# Altium footprint library Pin Header.PcbLib: 138 footprints (part 2 of 9)
Each footprint in its own frame and in the unit in brackets; x right, y up, seen from the top. Pads: shape width x height; smd on the part's side, far side on the other; paste and mask are expansions set on the pad; w line width, h text height; cw(c..) or ccw(c..) is an arc to the next point about the centre after c.
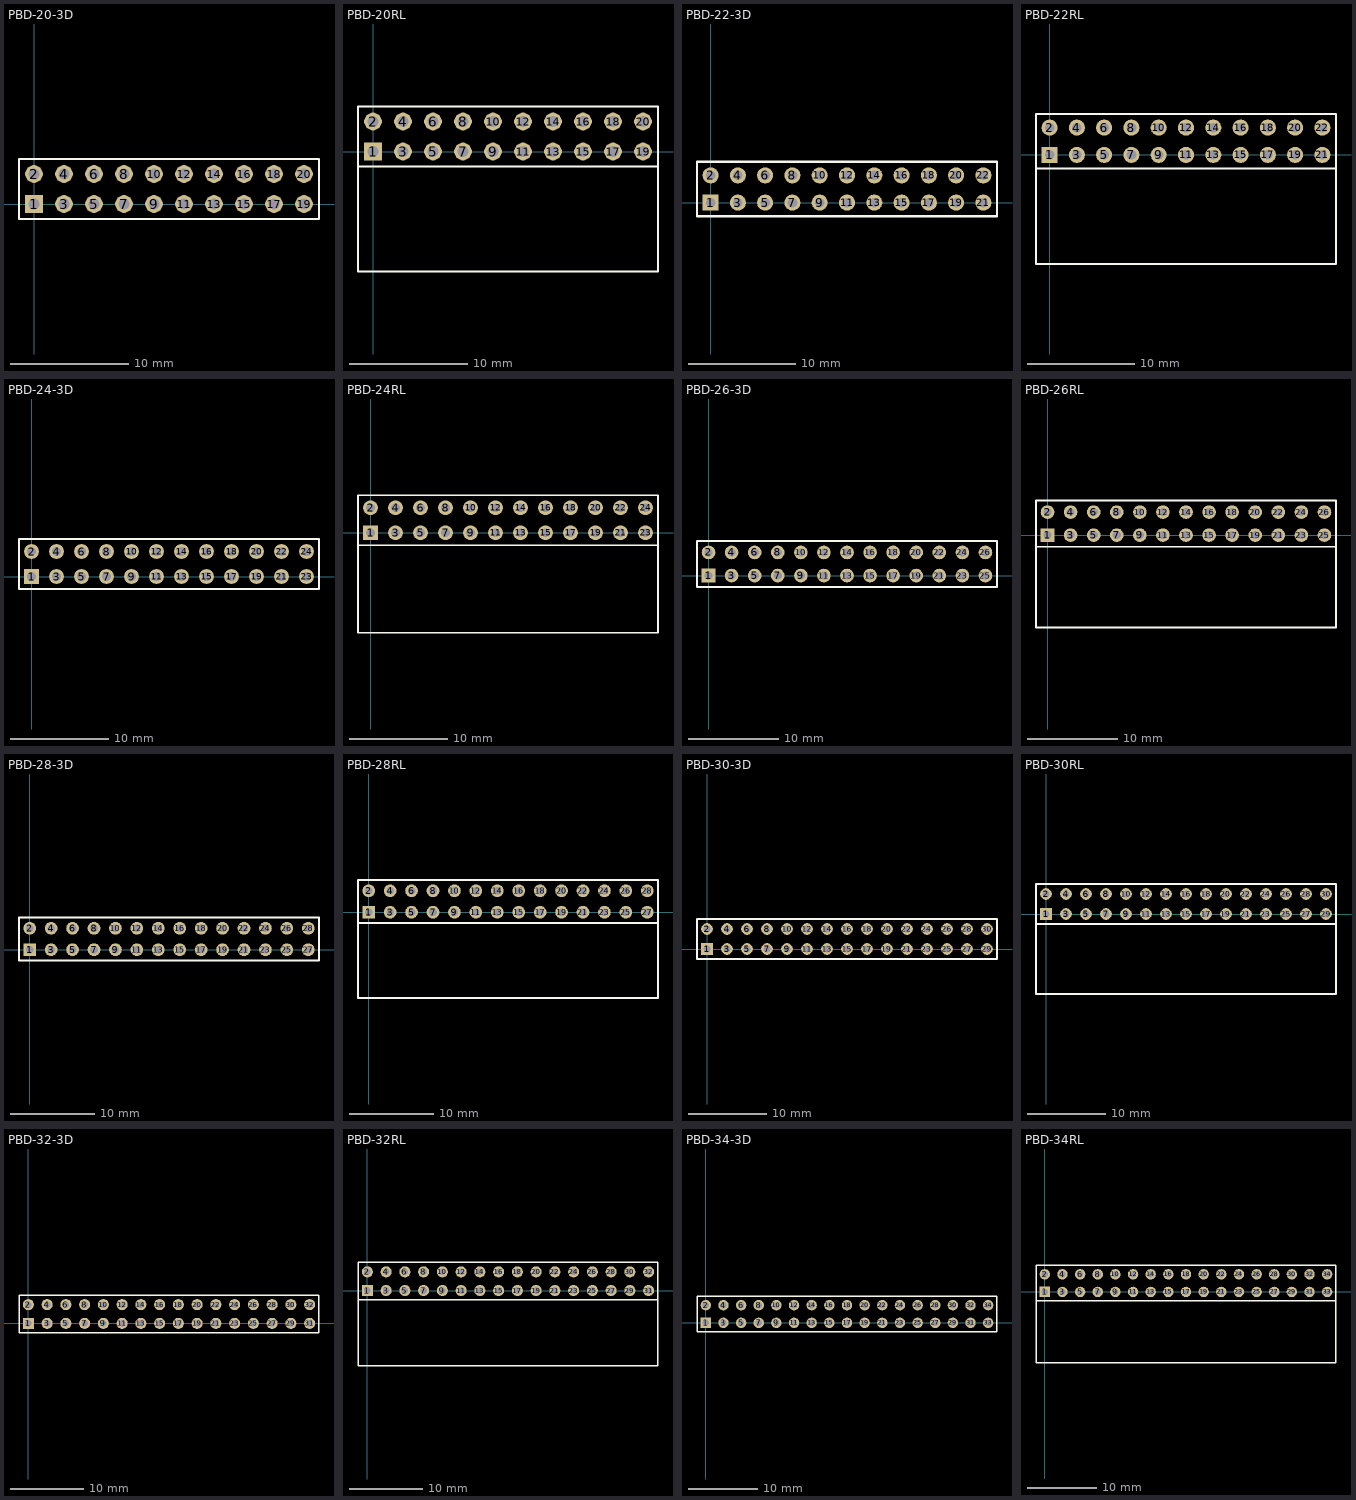
[diagram p1: the footprints below, top view; thin cyan lines are the x and y axes]

## PBD-20-3D [mm] "Connector; Header; 10x2 Position"
height 8
pads (20):
  rect 1.5x1.5 hole 0.9: 1(0,0)
  round 1.5 hole 0.9: 2(0,2.54) 3(2.54,0) 4(2.54,2.54) 5(5.08,0) 6(5.08,2.54) 7(7.62,0) 8(7.62,2.54) 9(10.16,0) 10(10.16,2.54) 11(12.7,0) 12(12.7,2.54) 13(15.24,0) 14(15.24,2.54) 15(17.78,0) 16(17.78,2.54) 17(20.32,0) 18(20.32,2.54) 19(22.86,0) 20(22.86,2.54)
Top Overlay:
  lines w0.2: -1.27,-1.27 -1.27,3.81 24.13,3.81 24.13,-1.27 -1.27,-1.27
3D body "PBD-2.stp": height 8.5, standoff -3.15, extent 19.05,-1.27 21.59,3.81
3D body "PBD-2.stp": height 8.5, standoff -3.15, extent 21.59,-1.27 24.13,3.81
3D body "PBD-2.stp": height 8.5, standoff -3.15, extent 13.97,-1.27 16.51,3.81
3D body "PBD-2.stp": height 8.5, standoff -3.15, extent 16.51,-1.27 19.05,3.81
3D body "PBD-2.stp": height 8.5, standoff -3.15, extent 8.89,-1.27 11.43,3.81
3D body "PBD-2.stp": height 8.5, standoff -3.15, extent 11.43,-1.27 13.97,3.81
3D body "PBD-2.stp": height 8.5, standoff -3.15, extent 3.81,-1.27 6.35,3.81
3D body "PBD-2.stp": height 8.5, standoff -3.15, extent 6.35,-1.27 8.89,3.81
3D body "PBD-2.stp": height 8.5, standoff -3.15, extent -1.27,-1.27 1.27,3.81
3D body "PBD-2.stp": height 8.5, standoff -3.15, extent 1.27,-1.27 3.81,3.81

## PBD-20RL [mm] "Connector; Header; 10x2 Position"
height 5
pads (20):
  rect 1.5x1.5 hole 0.9: 1(0,0)
  round 1.5 hole 0.9: 2(0,2.54) 3(2.54,0) 4(2.54,2.54) 5(5.08,0) 6(5.08,2.54) 7(7.62,0) 8(7.62,2.54) 9(10.16,0) 10(10.16,2.54) 11(12.7,0) 12(12.7,2.54) 13(15.24,0) 14(15.24,2.54) 15(17.78,0) 16(17.78,2.54) 17(20.32,0) 18(20.32,2.54) 19(22.86,0) 20(22.86,2.54)
Top Overlay:
  lines w0.2: -1.27,-1.27 -1.27,-10.16 24.13,-10.16 24.13,-1.27 ; -1.27,-1.27 24.13,-1.27 ; -1.27,-1.27 -1.27,3.81 24.13,3.81 24.13,-1.27
3D body "PBD-20R.step": height 5, standoff -3, extent -1.27,-10.16 24.13,2.84

## PBD-22-3D [mm] "Connector; Header; 11x2 Position"
height 8
pads (22):
  rect 1.5x1.5 hole 0.9: 1(0,0)
  round 1.5 hole 0.9: 2(0,2.54) 3(2.54,0) 4(2.54,2.54) 5(5.08,0) 6(5.08,2.54) 7(7.62,0) 8(7.62,2.54) 9(10.16,0) 10(10.16,2.54) 11(12.7,0) 12(12.7,2.54) 13(15.24,0) 14(15.24,2.54) 15(17.78,0) 16(17.78,2.54) 17(20.32,0) 18(20.32,2.54) 19(22.86,0) 20(22.86,2.54) 21(25.4,0) 22(25.4,2.54)
Top Overlay:
  lines w0.2: -1.27,-1.27 -1.27,3.81 26.67,3.81 26.67,-1.27 -1.27,-1.27
3D body "PBD-2.stp": height 8.5, standoff -3.15, extent 16.51,-1.27 19.05,3.81
3D body "PBD-2.stp": height 8.5, standoff -3.15, extent 13.97,-1.27 16.51,3.81
3D body "PBD-2.stp": height 8.5, standoff -3.15, extent 19.05,-1.27 21.59,3.81
3D body "PBD-2.stp": height 8.5, standoff -3.15, extent 8.89,-1.27 11.43,3.81
3D body "PBD-2.stp": height 8.5, standoff -3.15, extent 6.35,-1.27 8.89,3.81
3D body "PBD-2.stp": height 8.5, standoff -3.15, extent 11.43,-1.27 13.97,3.81
3D body "PBD-2.stp": height 8.5, standoff -3.15, extent 1.27,-1.27 3.81,3.81
3D body "PBD-2.stp": height 8.5, standoff -3.15, extent -1.27,-1.27 1.27,3.81
3D body "PBD-2.stp": height 8.5, standoff -3.15, extent 3.81,-1.27 6.35,3.81
3D body "PBD-2.stp": height 8.5, standoff -3.15, extent 21.59,-1.27 24.13,3.81
3D body "PBD-2.stp": height 8.5, standoff -3.15, extent 24.13,-1.27 26.67,3.81

## PBD-22RL [mm] "Connector; Header; 11x2 Position"
height 5
pads (22):
  rect 1.5x1.5 hole 0.9: 1(0,0)
  round 1.5 hole 0.9: 2(0,2.54) 3(2.54,0) 4(2.54,2.54) 5(5.08,0) 6(5.08,2.54) 7(7.62,0) 8(7.62,2.54) 9(10.16,0) 10(10.16,2.54) 11(12.7,0) 12(12.7,2.54) 13(15.24,0) 14(15.24,2.54) 15(17.78,0) 16(17.78,2.54) 17(20.32,0) 18(20.32,2.54) 19(22.86,0) 20(22.86,2.54) 21(25.4,0) 22(25.4,2.54)
Top Overlay:
  lines w0.2: -1.27,-1.27 -1.27,3.81 26.67,3.81 26.67,-1.27 ; -1.27,-1.27 26.67,-1.27 ; -1.27,-1.27 -1.27,-10.16 26.67,-10.16 26.67,-1.27
3D body "PBD-22R.step": height 5, standoff -3, extent -1.27,-10.16 26.67,2.84

## PBD-24-3D [mm] "Connector; Header; 12x2 Position"
height 8
pads (24):
  rect 1.5x1.5 hole 0.9: 1(0,0)
  round 1.5 hole 0.9: 2(0,2.54) 3(2.54,0) 4(2.54,2.54) 5(5.08,0) 6(5.08,2.54) 7(7.62,0) 8(7.62,2.54) 9(10.16,0) 10(10.16,2.54) 11(12.7,0) 12(12.7,2.54) 13(15.24,0) 14(15.24,2.54) 15(17.78,0) 16(17.78,2.54) 17(20.32,0) 18(20.32,2.54) 19(22.86,0) 20(22.86,2.54) 21(25.4,0) 22(25.4,2.54) 23(27.94,0) 24(27.94,2.54)
Top Overlay:
  lines w0.2: -1.27,-1.27 -1.27,3.81 29.21,3.81 29.21,-1.27 -1.27,-1.27
3D body "PBD-2.stp": height 8.5, standoff -3.15, extent 3.81,-1.27 6.35,3.81
3D body "PBD-2.stp": height 8.5, standoff -3.15, extent -1.27,-1.27 1.27,3.81
3D body "PBD-2.stp": height 8.5, standoff -3.15, extent 1.27,-1.27 3.81,3.81
3D body "PBD-2.stp": height 8.5, standoff -3.15, extent 11.43,-1.27 13.97,3.81
3D body "PBD-2.stp": height 8.5, standoff -3.15, extent 6.35,-1.27 8.89,3.81
3D body "PBD-2.stp": height 8.5, standoff -3.15, extent 8.89,-1.27 11.43,3.81
3D body "PBD-2.stp": height 8.5, standoff -3.15, extent 19.05,-1.27 21.59,3.81
3D body "PBD-2.stp": height 8.5, standoff -3.15, extent 13.97,-1.27 16.51,3.81
3D body "PBD-2.stp": height 8.5, standoff -3.15, extent 16.51,-1.27 19.05,3.81
3D body "PBD-2.stp": height 8.5, standoff -3.15, extent 26.67,-1.27 29.21,3.81
3D body "PBD-2.stp": height 8.5, standoff -3.15, extent 21.59,-1.27 24.13,3.81
3D body "PBD-2.stp": height 8.5, standoff -3.15, extent 24.13,-1.27 26.67,3.81

## PBD-24RL [mm] "Connector; Header; 12x2 Position"
height 5
pads (24):
  rect 1.5x1.5 hole 0.9: 1(0,0)
  round 1.5 hole 0.9: 2(0,2.54) 3(2.54,0) 4(2.54,2.54) 5(5.08,0) 6(5.08,2.54) 7(7.62,0) 8(7.62,2.54) 9(10.16,0) 10(10.16,2.54) 11(12.7,0) 12(12.7,2.54) 13(15.24,0) 14(15.24,2.54) 15(17.78,0) 16(17.78,2.54) 17(20.32,0) 18(20.32,2.54) 19(22.86,0) 20(22.86,2.54) 21(25.4,0) 22(25.4,2.54) 23(27.94,0) 24(27.94,2.54)
Top Overlay:
  lines w0.2: -1.27,-1.27 29.21,-1.27 ; -1.27,-1.27 -1.27,3.81 29.21,3.81 29.21,-1.27 ; -1.27,-1.27 -1.27,-10.16 29.21,-10.16 29.21,-1.27
3D body "PBD-24R.step": height 5, standoff -3, extent -1.27,-10.16 29.21,2.84

## PBD-26-3D [mm] "Connector; Header; 13x2 Position"
height 8
pads (26):
  rect 1.5x1.5 hole 0.9: 1(0,0)
  round 1.5 hole 0.9: 2(0,2.54) 3(2.54,0) 4(2.54,2.54) 5(5.08,0) 6(5.08,2.54) 7(7.62,0) 8(7.62,2.54) 9(10.16,0) 10(10.16,2.54) 11(12.7,0) 12(12.7,2.54) 13(15.24,0) 14(15.24,2.54) 15(17.78,0) 16(17.78,2.54) 17(20.32,0) 18(20.32,2.54) 19(22.86,0) 20(22.86,2.54) 21(25.4,0) 22(25.4,2.54) 23(27.94,0) 24(27.94,2.54) 25(30.48,0) 26(30.48,2.54)
Top Overlay:
  lines w0.2: -1.27,-1.27 31.75,-1.27 31.75,3.81 -1.27,3.81 -1.27,-1.27
3D body "PBD-2.stp": height 8.5, standoff -3.15, extent 29.21,-1.27 31.75,3.81
3D body "PBD-2.stp": height 8.5, standoff -3.15, extent 3.81,-1.27 6.35,3.81
3D body "PBD-2.stp": height 8.5, standoff -3.15, extent -1.27,-1.27 1.27,3.81
3D body "PBD-2.stp": height 8.5, standoff -3.15, extent 1.27,-1.27 3.81,3.81
3D body "PBD-2.stp": height 8.5, standoff -3.15, extent 11.43,-1.27 13.97,3.81
3D body "PBD-2.stp": height 8.5, standoff -3.15, extent 6.35,-1.27 8.89,3.81
3D body "PBD-2.stp": height 8.5, standoff -3.15, extent 8.89,-1.27 11.43,3.81
3D body "PBD-2.stp": height 8.5, standoff -3.15, extent 19.05,-1.27 21.59,3.81
3D body "PBD-2.stp": height 8.5, standoff -3.15, extent 13.97,-1.27 16.51,3.81
3D body "PBD-2.stp": height 8.5, standoff -3.15, extent 16.51,-1.27 19.05,3.81
3D body "PBD-2.stp": height 8.5, standoff -3.15, extent 26.67,-1.27 29.21,3.81
3D body "PBD-2.stp": height 8.5, standoff -3.15, extent 21.59,-1.27 24.13,3.81
3D body "PBD-2.stp": height 8.5, standoff -3.15, extent 24.13,-1.27 26.67,3.81

## PBD-26RL [mm] "Connector; Header; 13x2 Position"
height 5
pads (26):
  rect 1.5x1.5 hole 0.9: 1(0,0)
  round 1.5 hole 0.9: 2(0,2.54) 3(2.54,0) 4(2.54,2.54) 5(5.08,0) 6(5.08,2.54) 7(7.62,0) 8(7.62,2.54) 9(10.16,0) 10(10.16,2.54) 11(12.7,0) 12(12.7,2.54) 13(15.24,0) 14(15.24,2.54) 15(17.78,0) 16(17.78,2.54) 17(20.32,0) 18(20.32,2.54) 19(22.86,0) 20(22.86,2.54) 21(25.4,0) 22(25.4,2.54) 23(27.94,0) 24(27.94,2.54) 25(30.48,0) 26(30.48,2.54)
Top Overlay:
  lines w0.2: -1.27,-1.27 31.75,-1.27 ; -1.27,-1.27 -1.27,3.81 31.75,3.81 31.75,-1.27 ; -1.27,-1.27 -1.27,-10.16 31.75,-10.16 31.75,-1.27
3D body "PBD-26R.step": height 5, standoff -3, extent -1.27,-10.16 31.75,2.84

## PBD-28-3D [mm] "Connector; Header; 14x2 Position"
height 8
pads (28):
  rect 1.5x1.5 hole 0.9: 1(0,0)
  round 1.5 hole 0.9: 2(0,2.54) 3(2.54,0) 4(2.54,2.54) 5(5.08,0) 6(5.08,2.54) 7(7.62,0) 8(7.62,2.54) 9(10.16,0) 10(10.16,2.54) 11(12.7,0) 12(12.7,2.54) 13(15.24,0) 14(15.24,2.54) 15(17.78,0) 16(17.78,2.54) 17(20.32,0) 18(20.32,2.54) 19(22.86,0) 20(22.86,2.54) 21(25.4,0) 22(25.4,2.54) 23(27.94,0) 24(27.94,2.54) 25(30.48,0) 26(30.48,2.54) 27(33.02,0) 28(33.02,2.54)
Top Overlay:
  lines w0.2: -1.27,-1.27 -1.27,3.81 34.29,3.81 34.29,-1.27 -1.27,-1.27
3D body "PBD-2.stp": height 8.5, standoff -3.15, extent 24.13,-1.27 26.67,3.81
3D body "PBD-2.stp": height 8.5, standoff -3.15, extent 21.59,-1.27 24.13,3.81
3D body "PBD-2.stp": height 8.5, standoff -3.15, extent 26.67,-1.27 29.21,3.81
3D body "PBD-2.stp": height 8.5, standoff -3.15, extent 16.51,-1.27 19.05,3.81
3D body "PBD-2.stp": height 8.5, standoff -3.15, extent 13.97,-1.27 16.51,3.81
3D body "PBD-2.stp": height 8.5, standoff -3.15, extent 19.05,-1.27 21.59,3.81
3D body "PBD-2.stp": height 8.5, standoff -3.15, extent 8.89,-1.27 11.43,3.81
3D body "PBD-2.stp": height 8.5, standoff -3.15, extent 6.35,-1.27 8.89,3.81
3D body "PBD-2.stp": height 8.5, standoff -3.15, extent 11.43,-1.27 13.97,3.81
3D body "PBD-2.stp": height 8.5, standoff -3.15, extent 1.27,-1.27 3.81,3.81
3D body "PBD-2.stp": height 8.5, standoff -3.15, extent -1.27,-1.27 1.27,3.81
3D body "PBD-2.stp": height 8.5, standoff -3.15, extent 3.81,-1.27 6.35,3.81
3D body "PBD-2.stp": height 8.5, standoff -3.15, extent 29.21,-1.27 31.75,3.81
3D body "PBD-2.stp": height 8.5, standoff -3.15, extent 31.75,-1.27 34.29,3.81

## PBD-28RL [mm] "Connector; Header; 14x2 Position"
height 5
pads (28):
  rect 1.5x1.5 hole 0.9: 1(0,0)
  round 1.5 hole 0.9: 2(0,2.54) 3(2.54,0) 4(2.54,2.54) 5(5.08,0) 6(5.08,2.54) 7(7.62,0) 8(7.62,2.54) 9(10.16,0) 10(10.16,2.54) 11(12.7,0) 12(12.7,2.54) 13(15.24,0) 14(15.24,2.54) 15(17.78,0) 16(17.78,2.54) 17(20.32,0) 18(20.32,2.54) 19(22.86,0) 20(22.86,2.54) 21(25.4,0) 22(25.4,2.54) 23(27.94,0) 24(27.94,2.54) 25(30.48,0) 26(30.48,2.54) 27(33.02,0) 28(33.02,2.54)
Top Overlay:
  lines w0.2: -1.27,-1.27 34.29,-1.27 ; -1.27,-1.27 -1.27,3.81 34.29,3.81 34.29,-1.27 ; -1.27,-1.27 -1.27,-10.16 34.29,-10.16 34.29,-1.27
3D body "PBD-28R.step": height 5, standoff -3, extent -1.27,-10.16 34.29,2.84

## PBD-30-3D [mm] "Connector; Header; 15x2 Position"
height 8
pads (30):
  rect 1.5x1.5 hole 0.9: 1(0,0)
  round 1.5 hole 0.9: 2(0,2.54) 3(2.54,0) 4(2.54,2.54) 5(5.08,0) 6(5.08,2.54) 7(7.62,0) 8(7.62,2.54) 9(10.16,0) 10(10.16,2.54) 11(12.7,0) 12(12.7,2.54) 13(15.24,0) 14(15.24,2.54) 15(17.78,0) 16(17.78,2.54) 17(20.32,0) 18(20.32,2.54) 19(22.86,0) 20(22.86,2.54) 21(25.4,0) 22(25.4,2.54) 23(27.94,0) 24(27.94,2.54) 25(30.48,0) 26(30.48,2.54) 27(33.02,0) 28(33.02,2.54) 29(35.56,0) 30(35.56,2.54)
Top Overlay:
  lines w0.2: -1.27,-1.27 -1.27,3.81 36.83,3.81 36.83,-1.27 -1.27,-1.27
3D body "PBD-2.stp": height 8.5, standoff -3.15, extent 3.81,-1.27 6.35,3.81
3D body "PBD-2.stp": height 8.5, standoff -3.15, extent -1.27,-1.27 1.27,3.81
3D body "PBD-2.stp": height 8.5, standoff -3.15, extent 1.27,-1.27 3.81,3.81
3D body "PBD-2.stp": height 8.5, standoff -3.15, extent 11.43,-1.27 13.97,3.81
3D body "PBD-2.stp": height 8.5, standoff -3.15, extent 6.35,-1.27 8.89,3.81
3D body "PBD-2.stp": height 8.5, standoff -3.15, extent 8.89,-1.27 11.43,3.81
3D body "PBD-2.stp": height 8.5, standoff -3.15, extent 19.05,-1.27 21.59,3.81
3D body "PBD-2.stp": height 8.5, standoff -3.15, extent 13.97,-1.27 16.51,3.81
3D body "PBD-2.stp": height 8.5, standoff -3.15, extent 16.51,-1.27 19.05,3.81
3D body "PBD-2.stp": height 8.5, standoff -3.15, extent 26.67,-1.27 29.21,3.81
3D body "PBD-2.stp": height 8.5, standoff -3.15, extent 21.59,-1.27 24.13,3.81
3D body "PBD-2.stp": height 8.5, standoff -3.15, extent 24.13,-1.27 26.67,3.81
3D body "PBD-2.stp": height 8.5, standoff -3.15, extent 34.29,-1.27 36.83,3.81
3D body "PBD-2.stp": height 8.5, standoff -3.15, extent 29.21,-1.27 31.75,3.81
3D body "PBD-2.stp": height 8.5, standoff -3.15, extent 31.75,-1.27 34.29,3.81

## PBD-30RL [mm] "Connector; Header; 15x2 Position"
height 5
pads (30):
  rect 1.5x1.5 hole 0.9: 1(0,0)
  round 1.5 hole 0.9: 2(0,2.54) 3(2.54,0) 4(2.54,2.54) 5(5.08,0) 6(5.08,2.54) 7(7.62,0) 8(7.62,2.54) 9(10.16,0) 10(10.16,2.54) 11(12.7,0) 12(12.7,2.54) 13(15.24,0) 14(15.24,2.54) 15(17.78,0) 16(17.78,2.54) 17(20.32,0) 18(20.32,2.54) 19(22.86,0) 20(22.86,2.54) 21(25.4,0) 22(25.4,2.54) 23(27.94,0) 24(27.94,2.54) 25(30.48,0) 26(30.48,2.54) 27(33.02,0) 28(33.02,2.54) 29(35.56,0) 30(35.56,2.54)
Top Overlay:
  lines w0.2: -1.27,-1.27 -1.27,-10.16 36.83,-10.16 36.83,-1.27 ; -1.27,-1.27 36.83,-1.27 ; -1.27,-1.27 -1.27,3.81 36.83,3.81 36.83,-1.27
3D body "PBD-30R.step": height 5, standoff -3, extent -1.27,-10.16 36.83,2.84

## PBD-32-3D [mm] "Connector; Header; 16x2 Position"
height 8
pads (32):
  rect 1.5x1.5 hole 0.9: 1(0,0)
  round 1.5 hole 0.9: 2(0,2.54) 3(2.54,0) 4(2.54,2.54) 5(5.08,0) 6(5.08,2.54) 7(7.62,0) 8(7.62,2.54) 9(10.16,0) 10(10.16,2.54) 11(12.7,0) 12(12.7,2.54) 13(15.24,0) 14(15.24,2.54) 15(17.78,0) 16(17.78,2.54) 17(20.32,0) 18(20.32,2.54) 19(22.86,0) 20(22.86,2.54) 21(25.4,0) 22(25.4,2.54) 23(27.94,0) 24(27.94,2.54) 25(30.48,0) 26(30.48,2.54) 27(33.02,0) 28(33.02,2.54) 29(35.56,0) 30(35.56,2.54) 31(38.1,0) 32(38.1,2.54)
Top Overlay:
  lines w0.2: -1.27,-1.27 -1.27,3.81 39.37,3.81 39.37,-1.27 -1.27,-1.27
3D body "PBD-2.stp": height 8.5, standoff -3.15, extent 36.83,-1.27 39.37,3.81
3D body "PBD-2.stp": height 8.5, standoff -3.15, extent 3.81,-1.27 6.35,3.81
3D body "PBD-2.stp": height 8.5, standoff -3.15, extent -1.27,-1.27 1.27,3.81
3D body "PBD-2.stp": height 8.5, standoff -3.15, extent 1.27,-1.27 3.81,3.81
3D body "PBD-2.stp": height 8.5, standoff -3.15, extent 11.43,-1.27 13.97,3.81
3D body "PBD-2.stp": height 8.5, standoff -3.15, extent 6.35,-1.27 8.89,3.81
3D body "PBD-2.stp": height 8.5, standoff -3.15, extent 8.89,-1.27 11.43,3.81
3D body "PBD-2.stp": height 8.5, standoff -3.15, extent 19.05,-1.27 21.59,3.81
3D body "PBD-2.stp": height 8.5, standoff -3.15, extent 13.97,-1.27 16.51,3.81
3D body "PBD-2.stp": height 8.5, standoff -3.15, extent 16.51,-1.27 19.05,3.81
3D body "PBD-2.stp": height 8.5, standoff -3.15, extent 26.67,-1.27 29.21,3.81
3D body "PBD-2.stp": height 8.5, standoff -3.15, extent 21.59,-1.27 24.13,3.81
3D body "PBD-2.stp": height 8.5, standoff -3.15, extent 24.13,-1.27 26.67,3.81
3D body "PBD-2.stp": height 8.5, standoff -3.15, extent 34.29,-1.27 36.83,3.81
3D body "PBD-2.stp": height 8.5, standoff -3.15, extent 29.21,-1.27 31.75,3.81
3D body "PBD-2.stp": height 8.5, standoff -3.15, extent 31.75,-1.27 34.29,3.81

## PBD-32RL [mm] "Connector; Header; 16x2 Position"
height 5
pads (32):
  rect 1.5x1.5 hole 0.9: 1(0,0)
  round 1.5 hole 0.9: 2(0,2.54) 3(2.54,0) 4(2.54,2.54) 5(5.08,0) 6(5.08,2.54) 7(7.62,0) 8(7.62,2.54) 9(10.16,0) 10(10.16,2.54) 11(12.7,0) 12(12.7,2.54) 13(15.24,0) 14(15.24,2.54) 15(17.78,0) 16(17.78,2.54) 17(20.32,0) 18(20.32,2.54) 19(22.86,0) 20(22.86,2.54) 21(25.4,0) 22(25.4,2.54) 23(27.94,0) 24(27.94,2.54) 25(30.48,0) 26(30.48,2.54) 27(33.02,0) 28(33.02,2.54) 29(35.56,0) 30(35.56,2.54) 31(38.1,0) 32(38.1,2.54)
Top Overlay:
  lines w0.2: -1.27,-1.27 -1.27,-10.16 39.37,-10.16 39.37,-1.27 ; -1.27,-1.27 39.37,-1.27 ; -1.27,-1.27 -1.27,3.81 39.37,3.81 39.37,-1.27
3D body "PBD-32R.step": height 5, standoff -3, extent -1.27,-10.16 39.37,2.84

## PBD-34-3D [mm] "Connector; Header; 17x2 Position"
height 8
pads (34):
  rect 1.5x1.5 hole 0.9: 1(0,0)
  round 1.5 hole 0.9: 2(0,2.54) 3(2.54,0) 4(2.54,2.54) 5(5.08,0) 6(5.08,2.54) 7(7.62,0) 8(7.62,2.54) 9(10.16,0) 10(10.16,2.54) 11(12.7,0) 12(12.7,2.54) 13(15.24,0) 14(15.24,2.54) 15(17.78,0) 16(17.78,2.54) 17(20.32,0) 18(20.32,2.54) 19(22.86,0) 20(22.86,2.54) 21(25.4,0) 22(25.4,2.54) 23(27.94,0) 24(27.94,2.54) 25(30.48,0) 26(30.48,2.54) 27(33.02,0) 28(33.02,2.54) 29(35.56,0) 30(35.56,2.54) 31(38.1,0) 32(38.1,2.54) 33(40.64,0) 34(40.64,2.54)
Top Overlay:
  lines w0.2: -1.27,-1.27 41.91,-1.27 41.91,3.81 -1.27,3.81 -1.27,-1.27
3D body "PBD-2.stp": height 8.5, standoff -3.15, extent 39.37,-1.27 41.91,3.81
3D body "PBD-2.stp": height 8.5, standoff -3.15, extent 36.83,-1.27 39.37,3.81
3D body "PBD-2.stp": height 8.5, standoff -3.15, extent 3.81,-1.27 6.35,3.81
3D body "PBD-2.stp": height 8.5, standoff -3.15, extent -1.27,-1.27 1.27,3.81
3D body "PBD-2.stp": height 8.5, standoff -3.15, extent 1.27,-1.27 3.81,3.81
3D body "PBD-2.stp": height 8.5, standoff -3.15, extent 11.43,-1.27 13.97,3.81
3D body "PBD-2.stp": height 8.5, standoff -3.15, extent 6.35,-1.27 8.89,3.81
3D body "PBD-2.stp": height 8.5, standoff -3.15, extent 8.89,-1.27 11.43,3.81
3D body "PBD-2.stp": height 8.5, standoff -3.15, extent 19.05,-1.27 21.59,3.81
3D body "PBD-2.stp": height 8.5, standoff -3.15, extent 13.97,-1.27 16.51,3.81
3D body "PBD-2.stp": height 8.5, standoff -3.15, extent 16.51,-1.27 19.05,3.81
3D body "PBD-2.stp": height 8.5, standoff -3.15, extent 26.67,-1.27 29.21,3.81
3D body "PBD-2.stp": height 8.5, standoff -3.15, extent 21.59,-1.27 24.13,3.81
3D body "PBD-2.stp": height 8.5, standoff -3.15, extent 24.13,-1.27 26.67,3.81
3D body "PBD-2.stp": height 8.5, standoff -3.15, extent 34.29,-1.27 36.83,3.81
3D body "PBD-2.stp": height 8.5, standoff -3.15, extent 29.21,-1.27 31.75,3.81
3D body "PBD-2.stp": height 8.5, standoff -3.15, extent 31.75,-1.27 34.29,3.81

## PBD-34RL [mm] "Connector; Header; 17x2 Position"
height 5
pads (34):
  rect 1.5x1.5 hole 0.9: 1(0,0)
  round 1.5 hole 0.9: 2(0,2.54) 3(2.54,0) 4(2.54,2.54) 5(5.08,0) 6(5.08,2.54) 7(7.62,0) 8(7.62,2.54) 9(10.16,0) 10(10.16,2.54) 11(12.7,0) 12(12.7,2.54) 13(15.24,0) 14(15.24,2.54) 15(17.78,0) 16(17.78,2.54) 17(20.32,0) 18(20.32,2.54) 19(22.86,0) 20(22.86,2.54) 21(25.4,0) 22(25.4,2.54) 23(27.94,0) 24(27.94,2.54) 25(30.48,0) 26(30.48,2.54) 27(33.02,0) 28(33.02,2.54) 29(35.56,0) 30(35.56,2.54) 31(38.1,0) 32(38.1,2.54) 33(40.64,0) 34(40.64,2.54)
Top Overlay:
  lines w0.2: -1.27,-1.27 -1.27,-10.16 41.91,-10.16 41.91,-1.27 ; -1.27,-1.27 41.91,-1.27 ; -1.27,-1.27 -1.27,3.81 41.91,3.81 41.91,-1.27
3D body "PBD-34R.step": height 5, standoff -3, extent -1.27,-10.16 41.91,2.84